# Altium footprint library ICL_passives_v1.PcbLib: 102 footprints (part 3 of 7)
Each footprint in its own frame and in the unit in brackets; x right, y up, seen from the top. Pads: shape width x height; smd on the part's side, far side on the other; paste and mask are expansions set on the pad; w line width, h text height; cw(c..) or ccw(c..) is an arc to the next point about the centre after c.
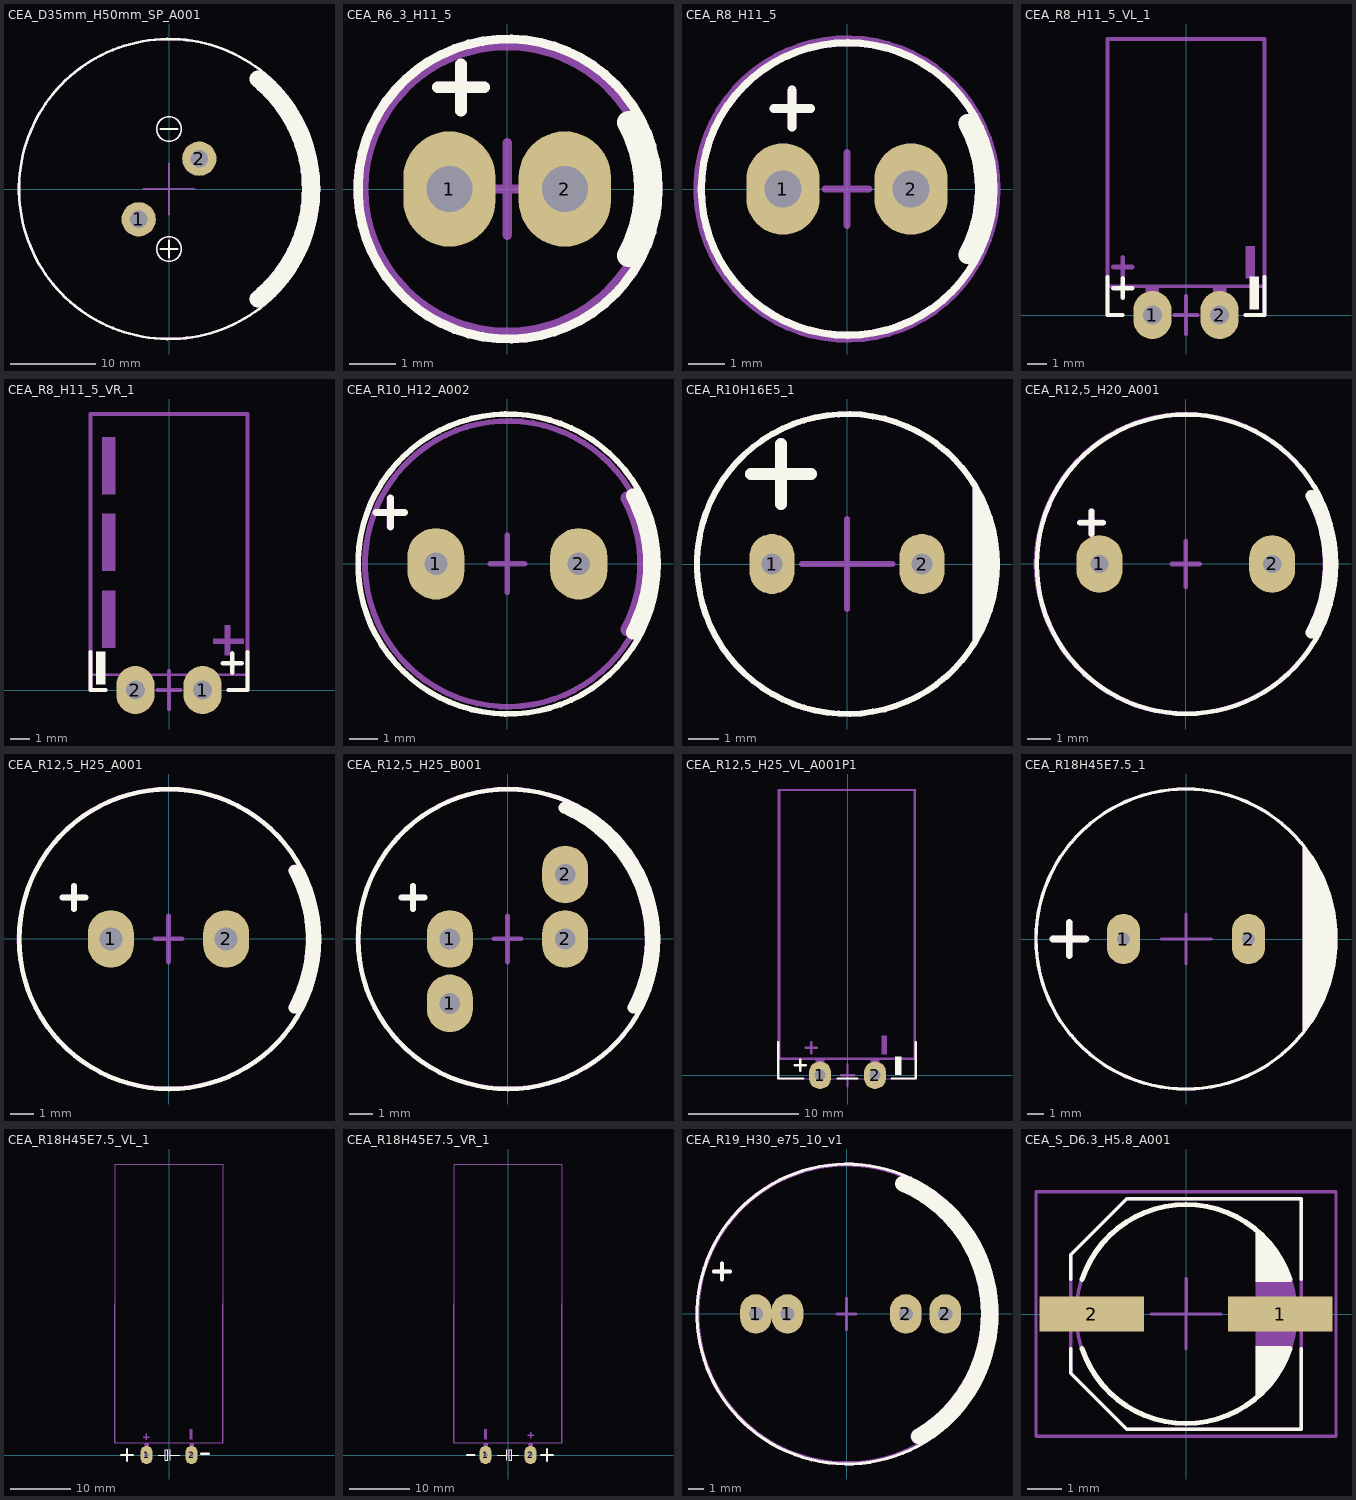
[diagram p2: the footprints below, top view; thin cyan lines are the x and y axes]

## CEA_D35mm_H50mm_SP_A001 [mm]
pads (2):
  round 4 hole 2 paste-1: 1(-3.535,-3.535) 2(3.535,3.535)
Top Overlay:
  circle w0.2: c0,7 r1.442
  circle w0.2: c0,-7 r1.442
  circle w0.3: c0,0 r17.5
  lines w0.2: -1,-7 0,-7 ; -1,7 0,7 1,7 ; 0,-8 0,-7 ; 0,-6 0,-7 ; 1,-7 0,-7
  lines w2: 10.376,-12.829 ccw(c0,0) 10.376,12.829
Top M15-16_SORG:
  lines w0.2: -2.994,-0.002 0.006,-0.002 ; 0,0 0,3 ; 0.006,-2.993 0.006,0.007 ; 0.006,0.015 3.006,0.015
Top M17-18_TDES:
  text "'.Designator'" at -11.33,-0.833 h2
Top M19-20_TMOT:
  circle w0.2: c0,-7 r1.442
  circle w0.2: c0,7 r1.442
  circle w0.3: c0,0 r17.5
  lines w0.2: -1,-7 0,-7 ; -1,7 0,7 1,7 ; 0,-8 0,-7 ; 0,-6 0,-7 ; 1,-7 0,-7
  lines w2: 10.376,-12.829 ccw(c0,0) 10.376,12.829
3D body "Capacitor_SnapIn_35x50mm.STEP": height 51.57, standoff -4.61, extent -17.746,-17.78 17.746,17.78

## CEA_R6_3_H11_5 [mm] "tht 2.5mm fi 6,3mm h 11.5mm"
pads (2):
  oval 2x2.5 hole 1: 1(-1.25,0) 2(1.25,0)
Top Overlay:
  circle w0.2: c0.018,0 r3.25
  lines w0.25: -1.5,2.2 -0.5,2.2 ; -1,1.7 -1,2.7
  lines w0.5: 2.634,-1.437 ccw(c0,0) 2.634,1.437
Top M17-18_TDES:
  text "'.Designator'" at 0.417,-5.665 h1
Top M19-20_TMOT:
  circle w0.2: c0.018,0 r3.25
  lines w0.25: -1.5,2.2 -0.5,2.2 ; -1,1.7 -1,2.7
  lines w0.5: 2.634,-1.437 ccw(c0,0) 2.634,1.437
Top M25-26_TORG:
  circle w0.2: c0,0 r3.105
  lines w0.2: -0.6,0 0.6,0 ; 0,-1 0,1
3D body "Cap electrolitic radial 6,3x12.STEP": height 12.01, standoff -1.49, extent -3.232,-3.233 3.232,3.233

## CEA_R8_H11_5 [mm] "snap 3.5mm fi 8mm h 11.5mm"
pads (2):
  oval 2x2.5 hole 1: 1(-1.75,0) 2(1.75,0)
Top Overlay:
  circle w0.2: c0.018,0 r4
  lines w0.25: -2,2.2 -1,2.2 ; -1.5,1.7 -1.5,2.7
  lines w0.5: 3.292,-1.796 ccw(c0,0) 3.292,1.796
Top M17-18_TDES:
  text "'.Designator'" at 0.417,-5.665 h1
Top M19-20_TMOT:
  circle w0.2: c0.018,0 r4
  lines w0.25: -2,2.2 -1,2.2 ; -1.5,1.7 -1.5,2.7
  lines w0.5: 3.292,-1.796 ccw(c0,0) 3.292,1.796
Top M25-26_TORG:
  circle w0.2: c0,0 r4.101
  lines w0.2: -0.6,0 0.6,0 ; 0,-1 0,1
3D body "CE_R150_D320_H570.step": height 14.41, standoff -2.89, extent -4.1,-4.1 4.1,4.1

## CEA_R8_H11_5_VL_1 [mm] "snap 3.5mm fi 8mm h 11.5mm"
pads (2):
  oval 2x2.5 hole 1: 1(-1.75,0) 2(1.75,0)
Top Overlay:
  rectangle: 3.3,0.3 3.8,2
  lines w0.2: -4.1,2 -4.1,0 -3.3,0 ; 3.1,0 4.1,0 4.1,2
  lines w0.25: -3.8,1.4 -2.8,1.4 ; -3.3,0.9 -3.3,1.9
Top M15-16_SORG:
  lines w0.2: -3.3,0 -4.1,0 -4.1,14.4 4.1,14.4 4.1,0 3.1,0 ; -0.6,0 0.6,0 ; 0,-1 0,1
Top M17-18_TDES:
  text "'.Designator'" at -5.665,-2.517 h1
Top M19-20_TMOT:
  rectangle: 1.406,0.6 2.106,1.5
  rectangle: -2.1,0.6 -1.4,1.5
  rectangle: 3.1,1.9 3.6,3.6
  lines w0.1: -2.3,-0.5 -1.2,0.6 ; -2.3,-0.5 -2.3,0.6 ; -2.3,-0.5 -1.2,-0.5 ; -2.3,0.6 -1.2,-0.5 ; -2.3,0.6 -1.2,0.6 ; -1.2,-0.5 -1.2,0.6 ; 1.206,-0.5 2.306,0.6 ; 1.206,-0.5 1.206,0.6 ; 1.206,-0.5 2.306,-0.5 ; 1.206,0.6 2.306,-0.5 ; 1.206,0.6 2.306,0.6 ; 2.306,-0.5 2.306,0.6
  lines w0.2: -4.1,1.5 -4.1,14.4 4.1,14.4 4.1,1.5 -4.1,1.5
  lines w0.25: -3.8,2.5 -2.8,2.5 ; -3.3,2 -3.3,3
3D body "CE_R150_D320_H570.step": height 10.1, standoff 1.9, extent -4.095,-2.9 4.1,14.4

## CEA_R8_H11_5_VR_1 [mm] "snap 3.5mm fi 8mm h 11.5mm"
pads (2):
  oval 2x2.5 hole 1: 1(1.75,0) 2(-1.75,0)
Top Overlay:
  rectangle: -3.8,0.3 -3.3,2
  lines w0.2: -4.1,2 -4.1,0 -3.3,0 ; 3.1,0 4.1,0 4.1,2
  lines w0.25: 2.8,1.4 3.8,1.4 ; 3.3,0.9 3.3,1.9
Top M15-16_SORG:
  lines w0.2: -3.3,0 -4.1,0 -4.1,14.4 4.1,14.4 4.1,0 3.1,0 ; -0.6,0 0.6,0 ; 0,-1 0,1
Top M17-18_TDES:
  text "'.Designator'" at 0.117,1.735 h1
Top M19-20_TMOT:
  circle w0.4: c-1.743,0.031 r0.2
  circle w0.4: c1.8,0 r0.2
  region: 3.9,2.4 3.9,2.7 2.3,2.7 2.3,2.4
  rectangle: -3.5,2.2 -2.8,5.2
  rectangle: -3.5,10.2 -2.8,13.2
  rectangle: 2.9,1.8 3.2,3.4
  rectangle: -3.5,6.2 -2.8,9.2
  lines w0.15: -4.1,0.8 -4.1,14.4 4.1,14.4 4.1,0.8 -4.1,0.8
3D body "CE_R150_D320_H570.step": height 8.3, standoff 0.1, extent -4.1,-2.9 4.095,14.4

## CEA_R10_H12_A002 [mm] "e=5mm fi 10mm h 12mm"
pads (2):
  oval 2x2.5 hole 0.8: 1(-2.5,0) 2(2.5,0)
Top Overlay:
  circle w0.2: c0.024,-0.008 r5.25
  lines w0.25: -4.594,1.792 -3.594,1.792 ; -4.094,1.292 -4.094,2.292
  lines w0.5: 4.395,-2.402 ccw(c0.006,-0.008) 4.395,2.387
Top M15-16_SORG:
  lines w0.2: -0.6,0 0.6,0 ; 0,-1 0,1
Top M17-18_TDES:
  text "'.Designator'" at -5.665,-2.717 h1
Top M19-20_TMOT:
  circle w0.2: c0.018,0 r5
  lines w0.25: -4.6,1.8 -3.6,1.8 ; -4.1,1.3 -4.1,2.3
  lines w0.5: 4.214,-2.298 ccw(c0,0) 4.214,2.298
3D body "CALL_R10_H12_THT_A001.stp": height 13.01, standoff -2.49, extent -5.25,-5.25 5.25,5.245

## CEA_R10H16E5_1 [mm] "fi 10mm L 16mm e 5mm"
pads (2):
  oval 1.5x2 hole 0.7 mask+0.1: 1(-2.5,0) 2(2.5,0)
Top Overlay:
  circle w0.2: c0,0 r5
  region: 4.2,2.6 4.2,-2.7 4.4,-2.5 4.4,-2.3 4.6,-2.1 4.6,-1.8 4.8,-1.6 4.8,-1.4 4.9,-1.3 4.9,-0.9 5,-0.8 5,0.8 4.9,0.9 4.9,1.3 4.8,1.4 4.8,1.6 4.6,1.8 4.6,2.1 4.5,2.2 4.5,2.3 4.3,2.5
  lines w0.4: -3.2,3 -1.2,3 ; -2.2,2 -2.2,4
Top M17-18_TDES:
  text "'.Designator'" at -6.798,-3.9 h1.2
Top M19-20_TMOT:
  circle w0.2: c0,0 r5
  region: 4.2,2.6 4.2,-2.7 4.4,-2.5 4.4,-2.3 4.6,-2.1 4.6,-1.8 4.8,-1.6 4.8,-1.4 4.9,-1.3 4.9,-0.9 5,-0.8 5,0.8 4.9,0.9 4.9,1.3 4.8,1.4 4.8,1.6 4.6,1.8 4.6,2.1 4.5,2.2 4.5,2.3 4.3,2.5
  lines w0.4: -3.2,3 -1.2,3 ; -2.2,2 -2.2,4
Top M25-26_TORG:
  lines w0.2: -1.5,0 0,0 ; 0,-1.5 0,0 ; 0,1.5 0,0 ; 0.017,-0.005 1.517,-0.005
3D body "CEA_R10H16E5_1.stp": height 16.01, standoff -3.09, extent -5,-5 4.99,5

## CEA_R12,5_H20_A001 [mm] "e=7.5mm fi 12,5mm h 20mm"
pads (2):
  oval 2x2.5 hole 0.8: 1(-3.75,0) 2(3.75,0)
Top Overlay:
  circle w0.2: c0.024,-0.008 r6.5
  lines w0.25: -4.594,1.792 -3.594,1.792 ; -4.094,1.292 -4.094,2.292
  lines w0.5: 5.449,-2.976 ccw(c0.006,-0.008) 5.449,2.961
Top M17-18_TDES:
  text "'.Designator'" at -5.665,-2.717 h1
Top M19-20_TMOT:
  circle w0.2: c0.018,0 r6.5
  lines w0.25: -4.6,1.8 -3.6,1.8 ; -4.1,1.3 -4.1,2.3
  lines w0.5: 5.443,-2.969 ccw(c0,0) 5.443,2.969
Top M25-26_TORG:
  circle w0.2: c0,0 r6.507
  lines w0.2: -0.6,0 0.6,0 ; 0,-1 0,1
3D body "Cap_EL_fi12_5_h20_e5.STEP": height 20.01, standoff -1.99, extent -6.25,-6.25 6.25,6.25

## CEA_R12,5_H25_A001 [mm] "e=5mm fi 12,5mm h 25mm"
pads (2):
  oval 2x2.5 hole 1: 1(-2.5,0) 2(2.5,0)
Top Overlay:
  circle w0.2: c0.024,-0.008 r6.5
  lines w0.25: -4.594,1.792 -3.594,1.792 ; -4.094,1.292 -4.094,2.292
  lines w0.5: 5.449,-2.976 ccw(c0.006,-0.008) 5.449,2.961
Top M15-16_SORG:
  lines w0.2: -0.6,0 0.6,0 ; 0,-1 0,1
Top M17-18_TDES:
  text "'.Designator'" at -5.665,-2.717 h1
Top M19-20_TMOT:
  circle w0.2: c0.018,0 r6.5
  lines w0.25: -4.6,1.8 -3.6,1.8 ; -4.1,1.3 -4.1,2.3
  lines w0.5: 5.443,-2.969 ccw(c0,0) 5.443,2.969
3D body "R12_5H25_v1.STEP": height 25.01, standoff -2.99, extent -6.25,-6.25 6.25,6.25

## CEA_R12,5_H25_B001 [mm] "e=5mm and 7.5mm fi 12,5mm h 25mm"
pads (4):
  oval 2x2.5 hole 0.9: 1(-2.5,-2.795) 1(-2.5,0) 2(2.5,0) 2(2.5,2.795)
Top Overlay:
  circle w0.2: c0.024,-0.008 r6.5
  lines w0.25: -4.594,1.792 -3.594,1.792 ; -4.094,1.292 -4.094,2.292
  lines w0.5: 2.466,5.683 cw(c0.006,-0.008) 5.449,-2.976
Top M15-16_SORG:
  lines w0.2: -0.6,0 0.6,0 ; 0,-1 0,1
Top M17-18_TDES:
  text "'.Designator'" at -7.265,4.183 h1
Top M19-20_TMOT:
  circle w0.2: c0.018,0 r6.5
  lines w0.25: -4.6,1.8 -3.6,1.8 ; -4.1,1.3 -4.1,2.3
  lines w0.5: 2.468,5.688 cw(c0,0) 5.443,-2.969
3D body "R12_5H25_v1.STEP": height 25.01, standoff -2.99, extent -6.25,-6.25 6.25,6.25

## CEA_R12,5_H25_VL_A001P1 [mm] "e=5mm fi 12,5mm h 25mm"
pads (2):
  oval 2x2.5 hole 1: 1(-2.5,0) 2(2.5,0)
Top Overlay:
  rectangle: 4.3,0 4.9,1.7
  lines w0.2: -6.3,3 -6.3,-0.3 -4,-0.3 ; -0.9,-0.3 0.9,-0.3 ; 4,-0.3 6.2,-0.3 6.2,3
  lines w0.25: -4.8,0.9 -3.8,0.9 ; -4.3,0.4 -4.3,1.4
Top M15-16_SORG:
  lines w0.1: -6.3,-0.3 6.2,-0.3 6.2,26 -6.3,26 -6.3,-0.3
  lines w0.2: -0.6,0 0.6,0 ; 0,-1 0,1
Top M17-18_TDES:
  text "'.Designator'" at -5.665,-2.417 h1
Top M19-20_TMOT:
  rectangle: 3.1,1.9 3.6,3.6
  rectangle: -2.9,0.55 -2.1,1.5
  rectangle: 2.1,0.55 2.9,1.5
  lines w0.1: -3.05,-0.55 -1.95,-0.55 ; -3.05,-0.55 -3.05,0.55 ; -3.05,-0.55 -1.95,0.55 ; -3.05,0.55 -1.95,0.55 ; -3.05,0.55 -1.95,-0.55 ; -1.95,-0.55 -1.95,0.55 ; 1.95,-0.55 3.05,-0.55 ; 1.95,-0.55 1.95,0.55 ; 1.95,-0.55 3.05,0.55 ; 1.95,0.55 3.05,0.55 ; 1.95,0.55 3.05,-0.55 ; 3.05,-0.55 3.05,0.55
  lines w0.2: -6.2,1.5 6.1,1.5 6.1,25.9 -6.2,25.9 -6.2,1.5
  lines w0.25: -3.8,2.5 -2.8,2.5 ; -3.3,2 -3.3,3
3D body "R12_5H25_v1_VL.STEP": height 12.75, standoff -2.75, extent -6.288,-0.3 6.198,26

## CEA_R18H45E7.5_1 [mm]
pads (2):
  oval 2x3 hole 0.8 mask+0.1: 1(-3.75,0) 2(3.75,0)
Top Overlay:
  circle w0.2: c0,0 r9
  region: 7,-5.6 8,-4.2 8.6,-2.7 9,-0.8 9,0.6 8.7,2.4 8,4.1 7,5.6
  lines w0.4: -8,0 -6,0 ; -7,-1 -7,1
Top M15-16_SORG:
  lines w0.2: -1.5,0 0,0 ; 0,-1.5 0,0 ; 0,1.5 0,0 ; 0.017,-0.005 1.517,-0.005
Top M17-18_TDES:
  text "'.Designator'" at -7.931,-3.983 h1.4
Top M19-20_TMOT:
  circle w0.2: c0,0 r9
  region: 7,-5.6 8,-4.2 8.6,-2.7 9,-0.8 9,0.6 8.7,2.4 8,4.1 7,5.6
  lines w0.4: -8,0 -6,0 ; -7,-1 -7,1
3D body "CAPAER_D180_L465_P075_W008X030.STEP": height 46.51, standoff -3, extent -9,-9 9.01,9

## CEA_R18H45E7.5_VL_1 [mm] "vertival left"
pads (2):
  oval 2x3 hole 0.8 mask+0.1: 1(-3.75,0) 2(3.75,0)
Top Overlay:
  lines w0.2: -1.8,0 -0.6,0 ; 0.2,-0.9 0.2,0.9 ; 0.2,0 1.8,0 ; -0.6,-0.9 -0.6,0.9 -0.2,0.9 -0.2,-0.9 -0.6,-0.9
  lines w0.4: -8,0 -6,0 ; -7,-1 -7,1 ; 5.4,0.2 6.6,0.2
Top M15-16_SORG:
  lines w0.1: -4,2 -4,1.2 -3.5,1.2 -3.5,2 ; -1,0 1,0 ; 0,0 0,1 ; 3.5,2 3.5,1.2 4,1.2 4,2 ; -9,2 -9,48.5 9,48.5 9,2 -9,2
Top M17-18_TDES:
  text "'.Designator'" at -7.931,5.467 h1.4
Top M19-20_TMOT:
  rectangle: 3.4,0.55 4.2,2
  rectangle: -4.1,0.55 -3.3,2
  rectangle: 3.4,2.6 3.9,4.3
  lines w0.1: -4.25,-0.55 -3.15,0.55 ; -4.25,-0.55 -4.25,0.55 ; -4.25,-0.55 -3.15,-0.55 ; -4.25,0.55 -3.15,-0.55 ; -4.25,0.55 -3.15,0.55 ; -3.15,-0.55 -3.15,0.55 ; 3.25,-0.55 4.35,0.55 ; 3.25,-0.55 3.25,0.55 ; 3.25,-0.55 4.35,-0.55 ; 3.25,0.55 4.35,-0.55 ; 3.25,0.55 4.35,0.55 ; 4.35,-0.55 4.35,0.55
  lines w0.2: -9,2 -9,48.5 9,48.5 9,2 -9,2
  lines w0.25: -4.3,3 -3.3,3 ; -3.8,2.5 -3.8,3.5
3D body "CAPAER_D180_L465_P075_W008X030.STEP": height 18, standoff 0, extent -9,-1 9.01,48.514

## CEA_R18H45E7.5_VR_1 [mm] "vertival right"
pads (2):
  oval 2x3 hole 0.8 mask+0.1: 1(-3.75,0) 2(3.75,0)
Top Overlay:
  lines w0.2: -1.8,0 -0.2,0 ; -0.2,-0.9 -0.2,0.9 ; 0.6,0 1.8,0 ; 0.2,-0.9 0.6,-0.9 0.6,0.9 0.2,0.9 0.2,-0.9
  lines w0.4: -6.8,0 -5.6,0 ; 5.5,0 7.5,0 ; 6.5,-1 6.5,1
Top M15-16_SORG:
  lines w0.1: -4,2 -4,1.2 -3.5,1.2 -3.5,2 ; -1,0 1,0 ; 0,0 0,1 ; 3.5,2 3.5,1.2 4,1.2 4,2 ; -9,2 9,2 9,48.5 -9,48.5 -9,2
Top M17-18_TDES:
  text "'.Designator'" at -7.931,5.467 h1.4
Top M19-20_TMOT:
  rectangle: 3.4,0.55 4.2,2
  rectangle: -4.1,0.55 -3.3,2
  rectangle: -4,2.6 -3.5,4.3
  lines w0.1: -4.25,-0.55 -3.15,0.55 ; -4.25,-0.55 -4.25,0.55 ; -4.25,-0.55 -3.15,-0.55 ; -4.25,0.55 -3.15,-0.55 ; -4.25,0.55 -3.15,0.55 ; -3.15,-0.55 -3.15,0.55 ; 3.25,-0.55 4.35,0.55 ; 3.25,-0.55 3.25,0.55 ; 3.25,-0.55 4.35,-0.55 ; 3.25,0.55 4.35,-0.55 ; 3.25,0.55 4.35,0.55 ; 4.35,-0.55 4.35,0.55
  lines w0.2: -9,2 -9,48.5 9,48.5 9,2 -9,2
  lines w0.25: 3.3,3.3 4.3,3.3 ; 3.8,2.8 3.8,3.8
3D body "CAPAER_D180_L465_P075_W008X030.STEP": height 18, standoff 0, extent -9.01,-1 9,48.514

## CEA_R19_H30_e75_10_v1 [mm] "e=7.5+10+12mm  fi 19mm h 30mm"
pads (4):
  oval 2x2.5 hole 0.9: 1(-5.75,0) 1(-3.75,0) 2(3.75,0) 2(6.25,0)
Top Overlay:
  circle w0.2: c0.024,-0.008 r9.5
  lines w0.25: -8.394,2.692 -7.394,2.692 ; -7.894,2.192 -7.894,3.192
  lines w1: 3.577,8.254 cw(c0.006,-0.008) 4.59,-7.752
Top M17-18_TDES:
  text "'.Designator'" at -5.265,3.183 h1
Top M19-20_TMOT:
  circle w0.2: c0.018,0 r9.5
  lines w0.25: -8.4,2.7 -7.4,2.7 ; -7.9,2.2 -7.9,3.2
  lines w1: 3.583,8.256 cw(c0,0) 4.549,-7.766
Top M25-26_TORG:
  circle w0.254: c0,0 r9.456
  lines w0.2: -0.6,0 0.6,0 ; 0,-1 0,1
3D body "18x25_v1.stp": height 30.01, standoff -2.49, extent -9.5,-9.498 9.498,9.5

## CEA_S_D6.3_H5.8_A001 [mm]
pads (2):
  rect 3x1 smd: 1(2.7,0) 2(-2.7,0)
Top Overlay:
  region: 2,-2.4 2.521,-1.879 2.567,-1.835 2.65,-1.737 2.724,-1.631 2.786,-1.519 2.812,-1.461 2.848,-1.399 2.908,-1.269 2.955,-1.134 2.988,-0.994 2.997,-0.923 2,-0.923 2,-0.993
  region: 2,2.4 2.678,1.722 2.719,1.675 2.79,1.573 2.85,1.463 2.898,1.348 2.916,1.289 2.933,1.246 2.96,1.157 2.977,1.067 2.987,0.975 2.987,0.929 2,0.929
  lines w0.1: -3.3,-1 -3.3,-1.7 -1.7,-3.3 3.3,-3.3 3.3,-1 ; -3.3,1 -3.3,1.7 -1.7,3.3 3.3,3.3 3.3,1
  lines w0.15: -2.979,-0.993 ccw(c0,0) 2.979,-0.993 ; -2.979,0.993 cw(c0,0) 2.979,0.993
Top M11-12_SMOT:
  circle w0.1: c0,0 r3.15
  rectangle: -3.5,-0.3 -3.3,0.3
  region: 3.485,0.289 3,0.289 3,-0.311 3.485,-0.311
  region: 2,2.4 2.356,2.044 2.533,1.867 2.811,1.451 3.002,0.989 3.1,0.498 3.1,0.248 3.1,-0.248 3.1,-0.498 3.002,-0.989 2.811,-1.451 2.533,-1.867 2.356,-2.044 2,-2.4
  lines w0.1: -3.3,-1.7 -1.7,-3.3 3.3,-3.3 3.3,3.3 -1.7,3.3 -3.3,1.7 -3.3,-1.7
Top M13-14_SDES:
  text "'.Designator'" at 0.417,-5.665 h1
Top M15-16_SORG:
  lines w0.1: -0.995,0 0.005,0 ; 0,-0.989 0,0.011 ; 0,0 1,0 ; 0.003,0.008 0.003,1.008 ; -4.3,-3.5 4.3,-3.5 4.3,3.5 -4.3,3.5 -4.3,-3.5
3D body "CEA_S_D6_3_H5_8_A001.stp": height 6.01, standoff 0.01, extent -3.482,-3.318 3.518,3.282